# Altium footprint library CAP_TH.PcbLib: 220 footprints (part 12 of 14)
Each footprint in its own frame and in the unit in brackets; x right, y up, seen from the top. Pads: shape width x height; smd on the part's side, far side on the other; paste and mask are expansions set on the pad; w line width, h text height; cw(c..) or ccw(c..) is an arc to the next point about the centre after c.
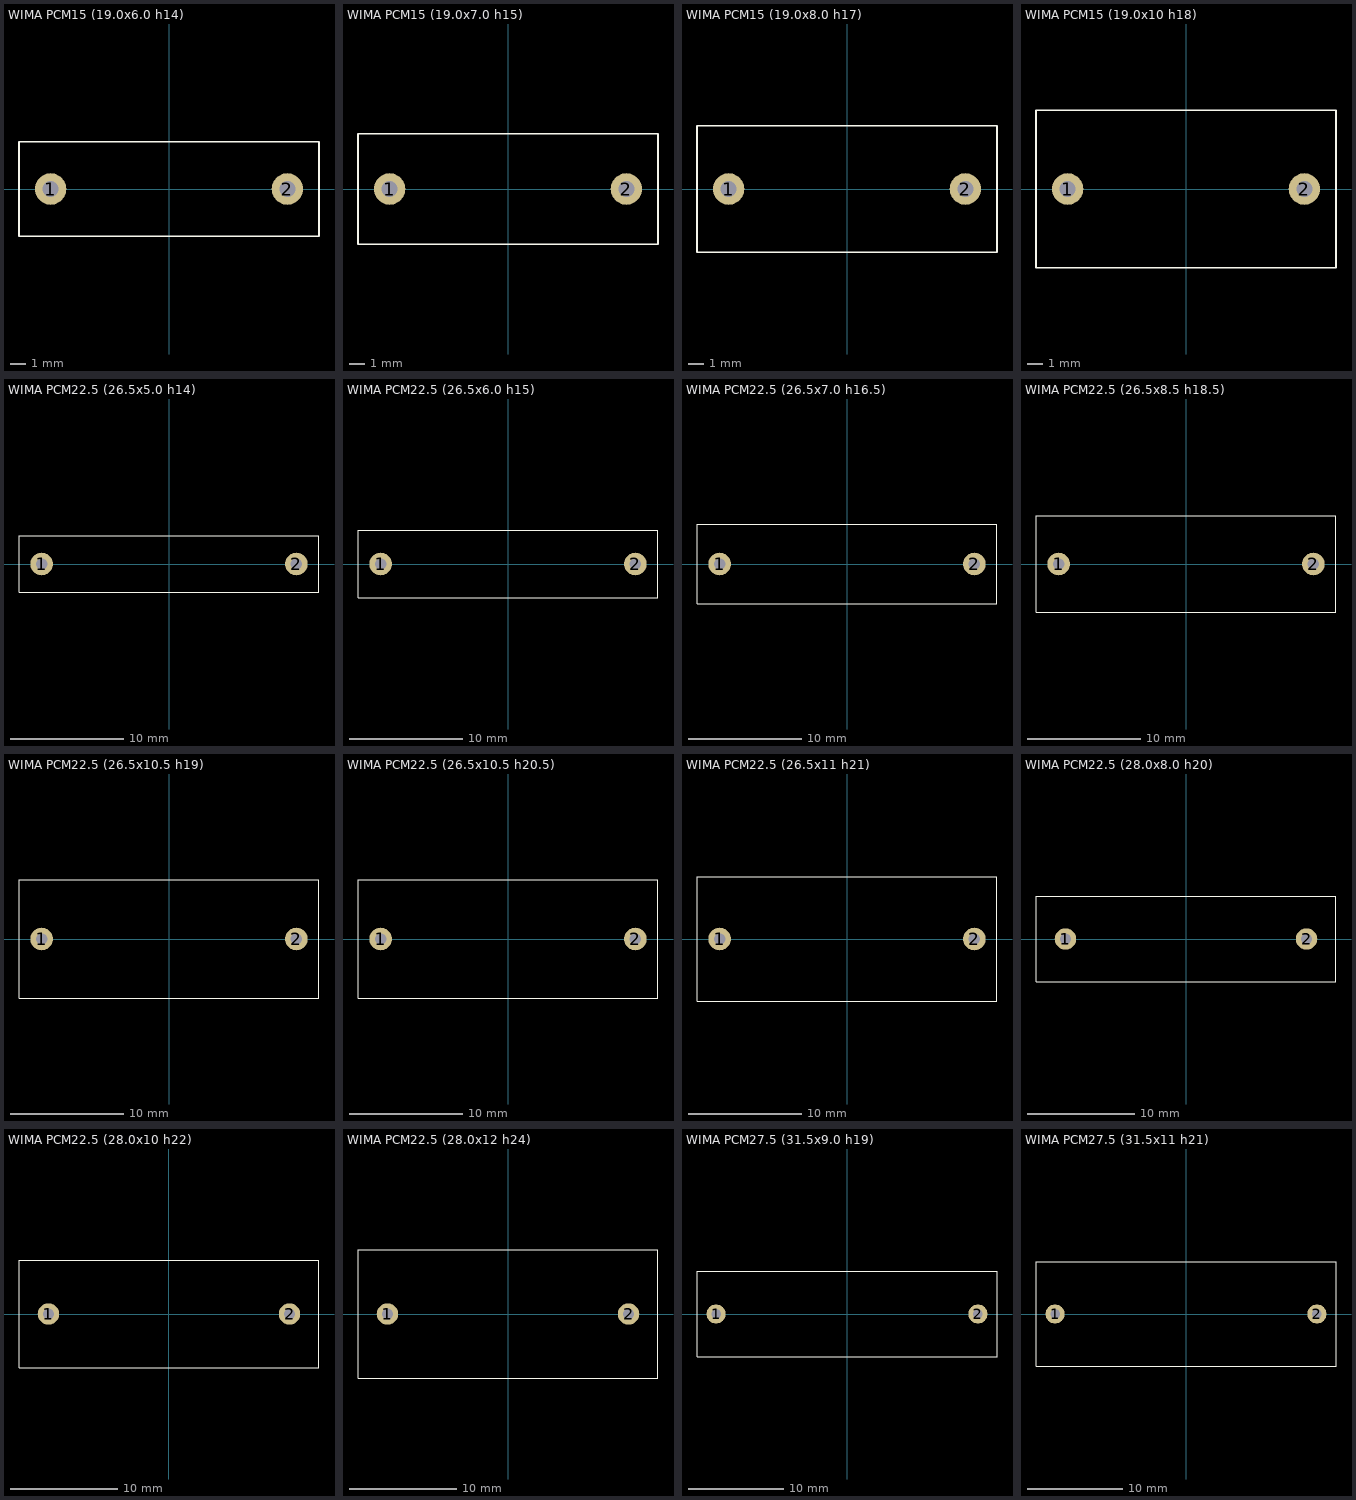
[diagram p11: the footprints below, top view; thin cyan lines are the x and y axes]

## WIMA PCM15 (19.0x6.0 h14) [mm]
pads (2):
  round 2 hole 1: 1(-7.5,0) 2(7.5,0)
Top Overlay:
  lines w0.1: -9.5,-3 9.5,-3 9.5,3 -9.5,3 -9.5,-3
3D body "WIMA PCM15 (19.0x6.0 h14).STEP": height 14, standoff -2, extent -9.5,-3 9.5,3

## WIMA PCM15 (19.0x7.0 h15) [mm]
pads (2):
  round 2 hole 1: 1(-7.5,0) 2(7.5,0)
Top Overlay:
  lines w0.1: -9.5,-3.5 9.5,-3.5 9.5,3.5 -9.5,3.5 -9.5,-3.5
3D body "WIMA PCM15 (19.0x7.0 h15).STEP": height 15, standoff -2, extent -9.5,-3.5 9.5,3.5

## WIMA PCM15 (19.0x8.0 h17) [mm]
pads (2):
  round 2 hole 1: 1(-7.5,0) 2(7.5,0)
Top Overlay:
  lines w0.1: -9.5,-4 -9.5,4 9.5,4 9.5,-4 -9.5,-4
3D body "WIMA PCM15 (19.0x8.0 h17).STEP": height 17, standoff -2, extent -9.5,-4 9.5,4

## WIMA PCM15 (19.0x10 h18) [mm]
pads (2):
  round 2 hole 1: 1(-7.5,0) 2(7.5,0)
Top Overlay:
  lines w0.1: -9.5,-5 -9.5,5 9.5,5 9.5,-5 -9.5,-5
3D body "WIMA PCM15 (19.0x10 h18).STEP": height 18, standoff -2, extent -9.5,-5 9.5,5

## WIMA PCM22.5 (26.5x5.0 h14) [mm]
pads (2):
  round 2 hole 1: 1(-11.25,0) 2(11.25,0)
Top Overlay:
  lines w0.1: -13.25,-2.5 13.25,-2.5 13.25,2.5 -13.25,2.5 -13.25,-2.5
3D body "WIMA PCM22.5 (26.5x5.0 h14).STEP": height 14, standoff -2, extent -13.25,-2.5 13.25,2.5

## WIMA PCM22.5 (26.5x6.0 h15) [mm]
pads (2):
  round 2 hole 1: 1(-11.25,0) 2(11.25,0)
Top Overlay:
  lines w0.1: -13.25,-3 -13.25,3 13.25,3 13.25,-3 -13.25,-3
3D body "WIMA PCM22.5 (26.5x6.0 h15).STEP": height 15, standoff -2, extent -13.25,-3 13.25,3

## WIMA PCM22.5 (26.5x7.0 h16.5) [mm]
pads (2):
  round 2 hole 1: 1(-11.25,0) 2(11.25,0)
Top Overlay:
  lines w0.1: -13.25,-3.5 13.25,-3.5 13.25,3.5 -13.25,3.5 -13.25,-3.5
3D body "WIMA PCM22.5 (26.5x7.0 h16.5).STEP": height 16.5, standoff -2, extent -13.25,-3.5 13.25,3.5

## WIMA PCM22.5 (26.5x8.5 h18.5) [mm]
pads (2):
  round 2 hole 1: 1(-11.25,0) 2(11.25,0)
Top Overlay:
  lines w0.1: -13.25,-4.25 -13.25,4.25 13.25,4.25 13.25,-4.25 -13.25,-4.25
3D body "WIMA PCM22.5 (26.5x8.5 h18.5).STEP": height 18.5, standoff -2, extent -13.25,-4.25 13.25,4.25

## WIMA PCM22.5 (26.5x10.5 h19) [mm]
pads (2):
  round 2 hole 1: 1(-11.25,0) 2(11.25,0)
Top Overlay:
  lines w0.1: -13.25,-5.25 -13.25,5.25 13.25,5.25 13.25,-5.25 -13.25,-5.25
3D body "WIMA PCM22.5 (26.5x10.5 h19).STEP": height 19, standoff -2, extent -13.25,-5.25 13.25,5.25

## WIMA PCM22.5 (26.5x10.5 h20.5) [mm]
pads (2):
  round 2 hole 1: 1(-11.25,0) 2(11.25,0)
Top Overlay:
  lines w0.1: -13.25,-5.25 -13.25,5.25 13.25,5.25 13.25,-5.25 -13.25,-5.25
3D body "WIMA PCM22.5 (26.5x10.5 h20.5).STEP": height 20.5, standoff -2, extent -13.25,-5.25 13.25,5.25

## WIMA PCM22.5 (26.5x11 h21) [mm]
pads (2):
  round 2 hole 1: 1(-11.25,0) 2(11.25,0)
Top Overlay:
  lines w0.1: -13.25,-5.5 -13.25,5.5 13.25,5.5 13.25,-5.5 -13.25,-5.5
3D body "WIMA PCM22.5 (26.5x11 h21).STEP": height 21, standoff -2, extent -13.25,-5.5 13.25,5.5

## WIMA PCM22.5 (28.0x8.0 h20) [mm]
pads (2):
  round 2 hole 1: 1(-11.25,0) 2(11.25,0)
Top Overlay:
  lines w0.1: -14,-4 -14,4 14,4 14,-4 -14,-4
3D body "WIMA PCM22.5 (28.0x8.0 h20).STEP": height 20, standoff -2, extent -14,-4 14,4

## WIMA PCM22.5 (28.0x10 h22) [mm]
pads (2):
  round 2 hole 1: 1(-11.25,0) 2(11.25,0)
Top Overlay:
  lines w0.1: -14,-5 -14,5 14,5 14,-5 -14,-5
3D body "WIMA PCM22.5 (28.0x10 h22).STEP": height 22, standoff -2, extent -14,-5 14,5

## WIMA PCM22.5 (28.0x12 h24) [mm]
pads (2):
  round 2 hole 1: 1(-11.25,0) 2(11.25,0)
Top Overlay:
  lines w0.1: -14,-6 -14,6 14,6 14,-6 -14,-6
3D body "WIMA PCM22.5 (28.0x12 h24).STEP": height 24, standoff -2, extent -14,-6 14,6

## WIMA PCM27.5 (31.5x9.0 h19) [mm]
pads (2):
  round 2 hole 1: 1(-13.75,0) 2(13.75,0)
Top Overlay:
  lines w0.1: -15.75,-4.5 15.75,-4.5 15.75,4.5 -15.75,4.5 -15.75,-4.5
3D body "WIMA PCM27.5 (31.5x9.0 h19).STEP": height 19, standoff -2, extent -15.75,-4.5 15.75,4.5

## WIMA PCM27.5 (31.5x11 h21) [mm]
pads (2):
  round 2 hole 1: 1(-13.75,0) 2(13.75,0)
Top Overlay:
  lines w0.1: -15.75,-5.5 15.75,-5.5 15.75,5.5 -15.75,5.5 -15.75,-5.5
3D body "WIMA PCM27.5 (31.5x11 h21).STEP": height 21, standoff -2, extent -15.75,-5.5 15.75,5.5